# Altium footprint library Connectors.PcbLib: 36 footprints (part 3 of 3)
Each footprint in its own frame and in the unit in brackets; x right, y up, seen from the top. Pads: shape width x height; smd on the part's side, far side on the other; paste and mask are expansions set on the pad; w line width, h text height; cw(c..) or ccw(c..) is an arc to the next point about the centre after c.
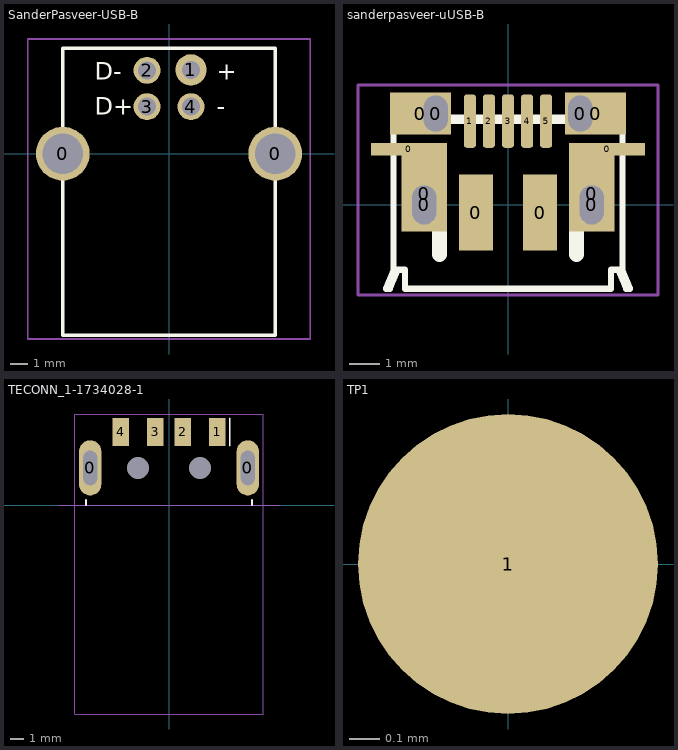
[diagram p2: the footprints below, top view; thin cyan lines are the x and y axes]

## SanderPasveer-USB-B [mil]
pads (6):
  round 120 hole 90: 0(-237,0) 0(237,0)
  round 70 hole 40: 1(49,187)
  round 60 hole 40: 2(-49,186) 3(-49,105) 4(49,105)
Top Overlay:
  lines w7.87: -237,-405 -237,235 237,235 237,-405 -237,-405
  text "-" at 106.3,86.61 h39.37
  text "+" at 106.3,165.35 h39.37
  text "D+" at -165.35,86.61 h39.37
  text "D-" at -165.35,165.35 h39.37
15. Courtyard TOP:
  lines w3.94: -314.96,-413.39 314.96,-413.39 314.96,255.91 -314.96,255.91 -314.96,-413.39
  text ".designator" at -59.06,-98.43 h39.37

## sanderpasveer-uUSB-B [mil]
pads (17):
  rect 100x16 smd: 0(-130,73) 0(130,73)
  rect 80x55 smd: 0(-115,120) 0(115,120)
  oval 39.37x59.06 hole 31.5 slot 51.18 at 90 deg: 0(-110,0) 0(110,0)
  rect 60x100 smd: 0(-110,15) 0(110,15)
  oval 39.37x55.12 hole 31.5 slot 47.24 at 90 deg: 0(-95,120) 0(95,120)
  rect 45x100 smd: 0(-42,-10) 0(42,-10)
  rrect50% 16x70 smd: 1(-50,110) 2(-25,110) 3(0,110) 4(25,110) 5(50,110)
Top Overlay:
  lines w8: -145,-85 -155,-110 -160,-110 -150,-85 ; -100,110 -100,120 -90,120 -90,115 90,115 90,120 100,120 100,110 ; 145,-85 155,-110 160,-110 150,-85 ; -150,-85 -135,-85 -135,-110 135,-110 135,-85 150,-85 ; -150,-85 -150,110 150,110 150,-85
  lines w20: -90,-65 -90,-10 ; 90,-65 90,-10
15. Courtyard TOP:
  lines w3.94: -196.85,-118.11 -196.85,157.48 196.85,157.48 196.85,-118.11 -196.85,-118.11
  text ".designator" at -59.06,0 h39.37

## TECONN_1-1734028-1 [mm] "USB Type A receptacle"
pads (8):
  oval 1.6x4 hole 1 slot 2.5 at 90 deg: 0(-5.7,2.7) 0(5.7,2.7)
  rect 1.2x2 smd: 1(3.5,5.3) 2(1,5.3) 3(-1,5.3) 4(-3.5,5.3)
  round 0 hole 1.6: ""(-2.25,2.7) ""(2.25,2.7)
Top Overlay:
  lines w0.12: -6,0 -6,0.4 ; 4.4,4.3 4.4,6.3 ; 6,0 6,0.4
15. Courtyard TOP:
  lines w0.05: -6.8,-15.1 -6.8,6.6 6.8,6.6 6.8,-15.1 -6.8,-15.1
20. Alignments:
  lines w0.05: -8,0 8,0

## TP1 [mm] "Testpoint SMD 1mm"
pads (1):
  round 1 smd: 1(0,0)